# Altium footprint library SOT SOD TO DAPK.PcbLib: 156 footprints (part 8 of 10)
Each footprint in its own frame and in the unit in brackets; x right, y up, seen from the top. Pads: shape width x height; smd on the part's side, far side on the other; paste and mask are expansions set on the pad; w line width, h text height; cw(c..) or ccw(c..) is an arc to the next point about the centre after c.
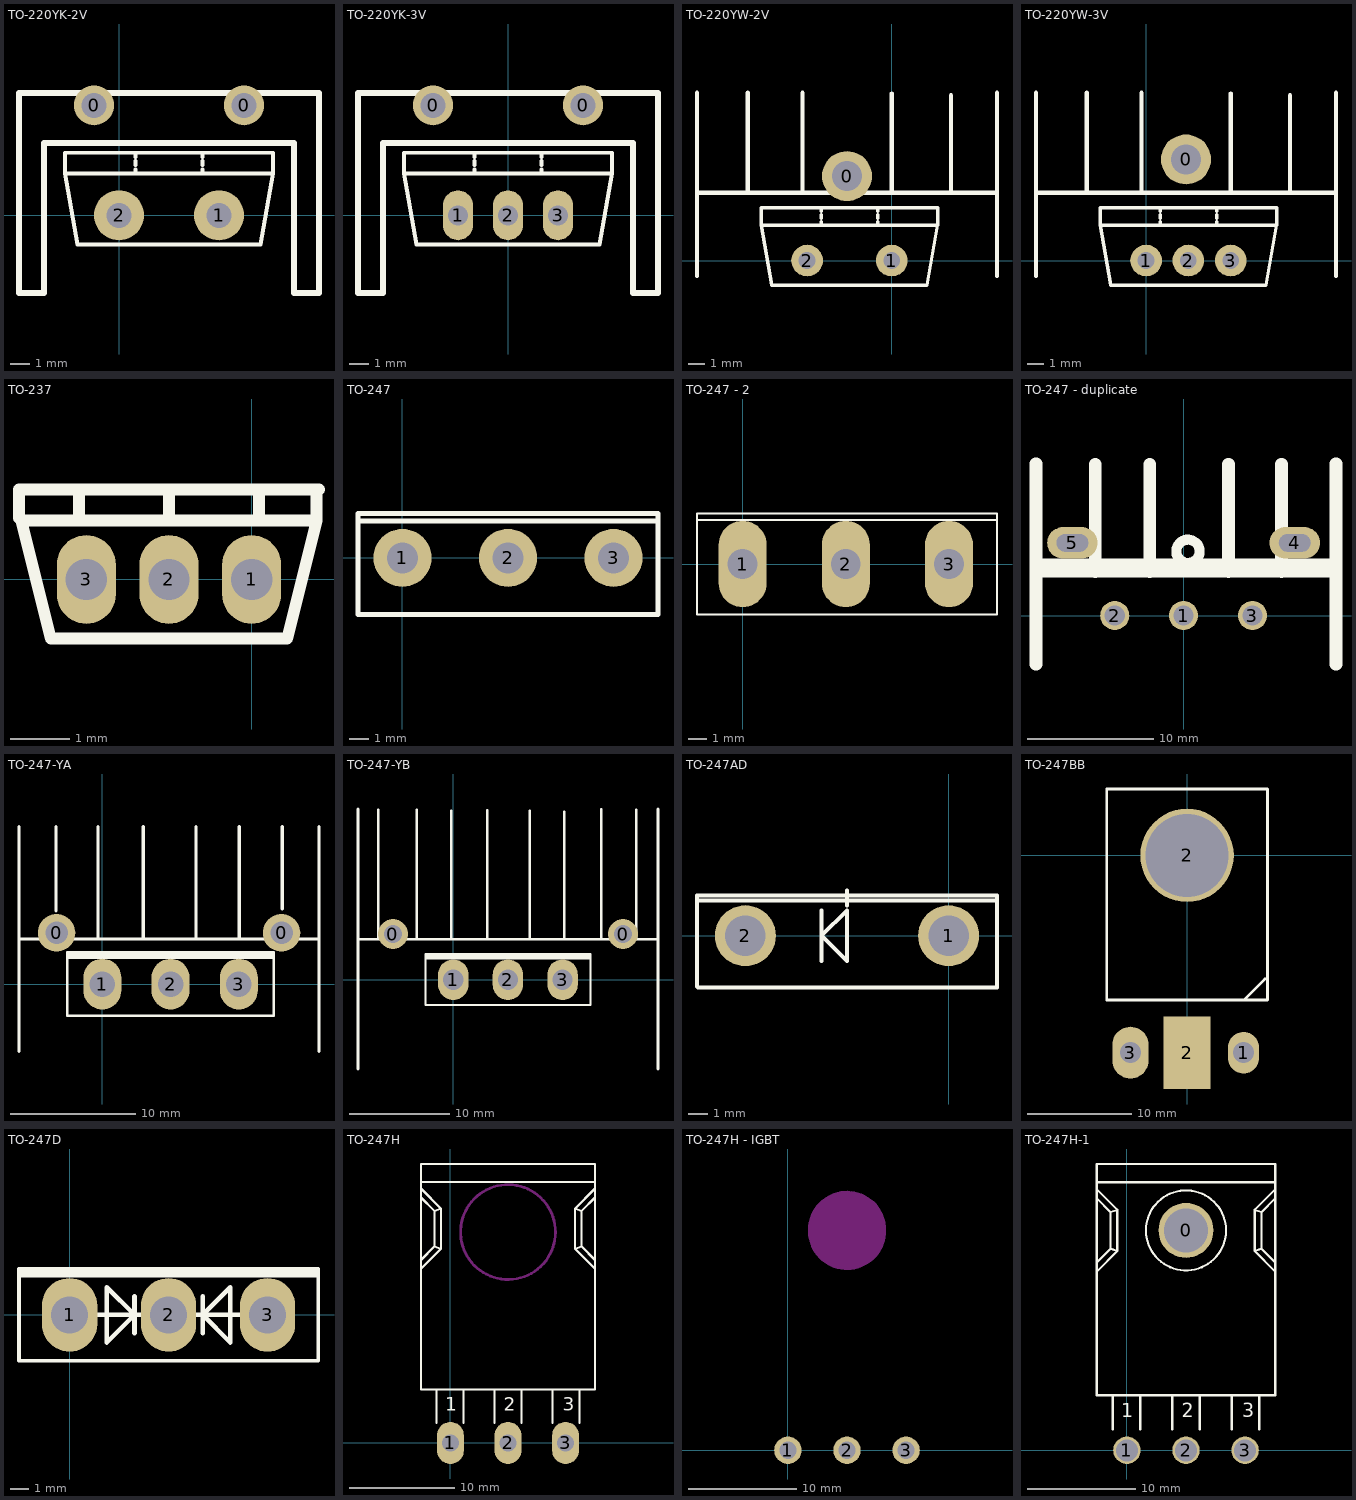
[diagram p7: the footprints below, top view; thin cyan lines are the x and y axes]

## TO-220YK-2V [mil]
pads (4):
  round 80 hole 50: 0(-50,220) 0(250,220)
  round 100 hole 50: 1(200,0) 2(0,0)
Top Overlay:
  lines w7.87: 33.33,83.33 33.33,91.67 ; 33.33,100 33.33,108.33 ; 33.33,116.67 33.33,125 ; 166.67,83.33 166.67,91.67 ; 166.67,100 166.67,108.33 ; 166.67,116.67 166.67,125 ; -108.33,83.33 308.33,83.33 ; -108.33,83.33 -83.33,-58.33 283.33,-58.33 308.33,83.33 ; -108.33,83.33 -108.33,125 308.33,125 308.33,83.33
  lines w12: -200,-155 -200,245 400,245 400,-155 350,-155 350,145 -150,145 -150,-155 -200,-155
3D body: height 1181.1, standoff 39.37, extent -205,-155 400,245
3D body "IC2.STEP": height 767.72, standoff -157.48, extent -106.69,-56.97 306.69,128.07

## TO-220YK-3V [mil]
pads (5):
  round 80 hole 50: 0(-150,220) 0(150,220)
  oval 60x100 hole 40: 1(-100,0) 2(0,0) 3(100,0)
Top Overlay:
  lines w7.87: -66.67,83.33 -66.67,91.67 ; -66.67,100 -66.67,108.33 ; -66.67,116.67 -66.67,125 ; 66.67,83.33 66.67,91.67 ; 66.67,100 66.67,108.33 ; 66.67,116.67 66.67,125 ; -208.33,83.33 208.33,83.33 ; -208.33,83.33 -183.33,-58.33 183.33,-58.33 208.33,83.33 ; -208.33,83.33 -208.33,125 208.33,125 208.33,83.33
  lines w12: -300,-155 -300,245 300,245 300,-155 250,-155 250,145 -250,145 -250,-155 -300,-155
3D body "User Library-TO220-AB Full.STEP": height 746.06, standoff -396.85, extent -194.88,-61.02 194.88,114.47
3D body: height 1181.1, standoff 39.37, extent -310,-160 295,240

## TO-220YW-2V [mm]
pads (3):
  round 3 hole 1.8: 0(-2.684,5.064)
  round 1.9 hole 1: 1(0,0) 2(-5.08,0)
Top Overlay:
  lines w0.2: -4.233,2.117 -4.233,2.328 ; -4.233,2.54 -4.233,2.752 ; -4.233,2.963 -4.233,3.175 ; -0.847,2.117 -0.847,2.328 ; -0.847,2.54 -0.847,2.752 ; -0.847,2.963 -0.847,3.175 ; -7.832,2.117 2.752,2.117 ; -7.832,2.117 -7.197,-1.482 2.117,-1.482 2.752,2.117 ; -7.832,2.117 -7.832,3.175 2.752,3.175 2.752,2.117
  lines w0.254: -11.684,-0.936 -11.684,10.064 ; -11.684,4.064 6.316,4.064 ; -8.636,4.064 -8.636,10.064 ; -5.362,4.208 -5.362,10.064 ; 0,4.064 0,10.029 ; 3.556,4.064 3.556,9.92 ; 6.316,-0.936 6.316,10.064
3D body "IC2.STEP": height 19.5, standoff -4, extent -8.044,-1.066 2.456,3.634
3D body: height 30, standoff 1, extent -12.065,-1.016 6.35,10.033

## TO-220YW-3V [mm]
pads (4):
  round 3 hole 1.8: 0(2.396,6.064)
  round 1.9 hole 1: 1(0,0) 2(2.54,0) 3(5.08,0)
Top Overlay:
  lines w0.2: 0.847,2.117 0.847,2.328 ; 0.847,2.54 0.847,2.752 ; 0.847,2.963 0.847,3.175 ; 4.233,2.117 4.233,2.328 ; 4.233,2.54 4.233,2.752 ; 4.233,2.963 4.233,3.175 ; -2.752,2.117 -2.752,3.175 7.832,3.175 7.832,2.117 ; -2.752,2.117 -2.117,-1.482 7.197,-1.482 7.832,2.117 ; -2.752,2.117 7.832,2.117
  lines w0.254: -6.604,-0.936 -6.604,10.064 ; -6.604,4.064 11.396,4.064 ; -3.556,4.064 -3.556,10.064 ; -0.282,4.208 -0.282,10.064 ; 5.08,4.064 5.08,10.029 ; 8.636,4.064 8.636,9.92 ; 11.396,-0.936 11.396,10.064
3D body "User Library-heat sink-1.STEP": height 30.62, standoff 0, extent -9.037,-3.827 13.863,12.573
3D body "User Library-TO220-AB PCB.STEP": height 20.05, standoff -3.5, extent -2.664,-1.651 7.236,2.806

## TO-237 [mm]
pads (3):
  oval 1x1.5 hole 0.7: 1(0,0) 2(-1.4,0) 3(-2.8,0)
Top Overlay:
  lines w0.2: -2.924,1 -2.924,1.524 ; -1.4,1 -1.4,1.524 ; 0.124,1 0.124,1.524 ; -3.9,1 -3.94,1.04 -3.94,1.524 1.14,1.524 1.1,1.484 1.1,1 ; -3.9,1 1.1,1 ; -3.9,1 -3.4,-1 0.6,-1 1.1,1

## TO-247 [mm]
height 0.9
pads (3):
  round 3 hole 1.6: 1(0,0) 2(5.45,0) 3(10.9,0)
Top Overlay:
  lines w0.254: -2.297,1.905 13.07,1.905 ; -2.297,-2.921 -2.297,2.286 13.197,2.286 13.197,-2.921 -2.297,-2.921
3D body "User Library-IRFP2907.step": height 25, standoff -9.85, extent -2.3,-2.5 13.2,2.5

## TO-247 - 2 [mil]
pads (3):
  oval 100x180 hole 62: 1(0,0) 2(215,0) 3(430,0)
Top Overlay:
  lines w3.94: -95,91.42 529.33,91.42 530,90.75 ; -95,-105 -95,105 530,105 530,-105 -95,-105
3D body "User Library-IRFP2907.step": height 984.25, standoff -387.64, extent -90.12,-98.43 520.12,98.43

## TO-247 - duplicate [mm]
pads (5):
  round 2.3 hole 1.6: 1(0,0) 2(-5.45,0) 3(5.45,0)
  oval 4x2.5 hole 1.4 slot 2.5 at 0 deg: 4(8.8,5.75) 5(-8.8,5.75)
Top Overlay:
  circle w0.8: c0.345,5.08 r0.925
  lines w1: -11.684,-3.849 -11.684,12.006 ; -6.985,3.486 -6.985,11.986 ; -2.667,3.486 -2.667,11.986 ; 3.556,3.486 3.556,11.986 ; 7.747,3.486 7.747,11.986 ; 12.065,-3.849 12.065,12.006
  lines w1.5: -11.43,3.75 11.43,3.75
Mechanical 15:
  lines w0.1: -0.5,0 0.5,0 ; 0,-0.5 0,0.5
3D body "User Library-TO_247.STEP": height 25, standoff -11.05, extent -7.9,-2.337 7.9,2.973

## TO-247-YA [mil]
pads (5):
  round 118.11 hole 70.87: 0(-144.29,161.42) 0(564.37,161.42)
  oval 120x160 hole 80: 1(0,0) 2(215,0) 3(430,0)
Top Overlay:
  lines w7.87: -110,83.33 540,83.33 ; -110,86.67 540,86.67 ; -110,91.67 540,91.67 ; -110,95 540,95 ; -110,-100 540,-100 540,100 -110,100 -110,-100
  lines w10: -262.4,-212.32 -262.4,496.34 ; -262.4,141.73 682.48,141.73 ; -145.39,230.94 -145.39,496.34 ; -13.5,147.4 -13.5,496.34 ; 128.94,141.73 128.94,496.34 ; 295.12,143.11 295.12,496.34 ; 431.1,147.4 431.1,496.34 ; 566.77,236.57 566.77,496.34 ; 682.48,-212.32 682.48,496.34
3D body "User Library-TO_247.STEP": height 1102.36, standoff -316.86, extent -101.02,-100 521.02,109.06

## TO-247-YB [mil]
pads (5):
  round 118.11 hole 70.87: 0(-237.64,179.29) 0(667.87,179.29)
  oval 120x160 hole 80: 1(0,0) 2(215,0) 3(430,0)
Top Overlay:
  lines w7.87: -110,83.33 540,83.33 ; -110,86.67 540,86.67 ; -110,91.67 540,91.67 ; -110,95 540,95 ; 6.79,82.94 423.45,82.94 ; 148.45,82.94 148.45,91.27 ; -110,-100 540,-100 540,100 -110,100 -110,-100
  lines w10: -375.43,-351.93 -375.43,671.69 ; -375.43,159.61 805.67,159.61 ; -295.47,167.44 -295.47,668.19 ; -144.41,159.61 -144.41,668.15 ; -8.43,165.28 -8.43,663.9 ; 134.02,159.61 134.02,665.98 ; 300.2,160.98 300.2,663.86 ; 436.18,165.28 436.18,661.65 ; 582.91,165.28 582.91,670.32 ; 720,159.61 720,669.25 ; 805.67,-351.93 805.67,671.69
3D body "User Library-TO_247.STEP": height 1062.99, standoff -356.23, extent -97.05,-70 525,139.06
3D body "User Library-Heat Sink 6400BG.STEP": height 2559.06, standoff -118.11, extent -683.54,-370 970,630

## TO-247AD [mil]
pads (2):
  round 120 hole 80: 1(0,0) 2(-400,0)
Top Overlay:
  lines w7.87: -200,59.05 -200,88.58 -200,78.74 ; 95.28,68.9 -495.28,68.9 -495.28,-100 ; -495.28,-100 -493.7,-101.58 95.28,-101.58 95.28,78.74 -495.28,78.74 -495.28,-100
  lines w8: -250,-50 -250,50 ; 95.28,-101.58 95.28,68.9 ; -250,0 -200,50 -200,-50 -250,0
3D body "User Library-IRFP2907.STEP": height 1062.99, standoff -308.9, extent -500.12,-121.85 110.12,75

## TO-247BB [mm]
pads (4):
  oval 3x4 hole 2.032: 1(5.45,-19)
  rect 4.5x7 all layers, no hole: 2(0,-19)
  round 9 hole 8: 2(0,0)
  oval 3.5x5 hole 2.032: 3(-5.45,-19)
Top Overlay:
  lines w0.254: 5.461,-13.927 7.493,-11.895 7.747,-11.895 ; -7.747,-13.927 7.747,-13.927 7.747,6.393 -7.747,6.393 -7.747,-13.927
3D body "User Library-TO-247H.STEP": height 3.9, standoff -8, extent -8.004,-19.138 7.496,6.262

## TO-247D [mil]
pads (3):
  oval 120x160 hole 80: 1(0,0) 2(215,0) 3(430,0)
Top Overlay:
  rectangle: -109.96,81.58 541.73,103.74
  lines w7.87: -110,-100 -110,100 540,100 540,-100 -110,-100
  lines w10: 60.86,0 160.86,0 ; 140.86,-40 140.86,40 ; 269.14,0 369.14,0 ; 289.14,-40 289.14,40 ; 80.86,-60 140.86,0 80.86,60 80.86,-40 80.86,-60 ; 289.14,0 349.14,60 349.14,-40 349.14,-60 289.14,0
3D body "User Library-TO_247.STEP": height 1102.36, standoff -316.86, extent -96.02,-94.06 526.02,115

## TO-247H [mm]
pads (3):
  oval 2.54x4 hole 1.6: 1(0,0) 2(5.461,0) 3(10.922,0)
Top Overlay:
  lines w0.2: -2.794,16.51 -0.889,18.415 ; -2.794,17.357 -1.524,18.627 ; -2.794,23.283 -1.524,22.013 ; -2.794,24.13 -0.889,22.225 ; -2.794,24.765 13.716,24.765 ; -1.312,1.905 -1.312,5.08 ; 1.228,1.905 1.228,5.08 ; 4.191,1.905 4.191,5.08 ; 6.731,1.905 6.731,5.08 ; 9.694,1.905 9.694,5.08 ; 12.234,1.905 12.234,5.08 ; 13.716,16.51 11.811,18.415 ; 13.716,17.357 12.446,18.627 ; 13.716,23.283 12.446,22.013 ; 13.716,24.13 11.811,22.225 ; -1.524,18.627 -0.889,18.415 ; -1.524,18.627 -1.524,22.013 ; -1.524,22.013 -0.889,22.225 ; -0.889,18.415 -0.889,22.225 ; 11.811,18.415 12.446,18.627 ; 11.811,18.415 11.811,22.225 ; 11.811,22.225 12.446,22.013 ; 12.446,18.627 12.446,22.013 ; -2.794,5.08 -2.794,26.458 13.716,26.458 13.716,5.08 -2.794,5.08
  text "3" at 10.668,3.048 h1.27
  text "2" at 5.08,3.048 h1.27
  text "1" at -0.508,3.048 h1.27
Keep-Out Layer:
  circle w0.254: c5.461,20 r4.5
3D body "User Library-TO-247H.STEP": height 2.9, standoff -9, extent -2.292,-0.254 13.208,25.146

## TO-247H - IGBT [mm]
pads (3):
  round 2.54 hole 1.575: 1(0,0) 2(5.461,0) 3(10.922,0)
Bottom Overlay:
  circle w0.2: c5.461,20.32 r1.5
  lines w0.2: -2.794,16.51 -0.889,18.415 ; -2.794,17.357 -1.524,18.627 ; -2.794,23.283 -1.524,22.013 ; -2.794,24.13 -0.889,22.225 ; -2.794,24.765 13.716,24.765 ; -1.312,1.905 -1.312,5.08 ; 1.228,1.905 1.228,5.08 ; 4.191,1.905 4.191,5.08 ; 6.731,1.905 6.731,5.08 ; 9.694,1.905 9.694,5.08 ; 12.234,1.905 12.234,5.08 ; 13.716,16.51 11.811,18.415 ; 13.716,17.357 12.446,18.627 ; 13.716,23.283 12.446,22.013 ; 13.716,24.13 11.811,22.225 ; -1.524,18.627 -1.524,22.013 ; -1.524,18.627 -0.889,18.415 ; -1.524,22.013 -0.889,22.225 ; -0.889,18.415 -0.889,22.225 ; 11.811,18.415 11.811,22.225 ; 11.811,18.415 12.446,18.627 ; 11.811,22.225 12.446,22.013 ; 12.446,18.627 12.446,22.013 ; -2.794,5.08 13.716,5.08 13.716,26.458 -2.794,26.458 -2.794,5.08
  text "3" at 11.43,3.048 h1.27
  text "2" at 5.842,3.048 h1.27
  text "1" at 0.254,3.048 h1.27
Keep-Out Layer:
  circle w0.1: c5.461,20.32 r3.6
  board cut-out: 9.061,20.326 9.061,20.561 8.999,21.028 8.878,21.482 8.697,21.917 8.462,22.324 8.176,22.697 7.843,23.03 7.47,23.317 7.062,23.552 6.628,23.732 6.173,23.854 5.707,23.915 5.472,23.915 5.451,23.915 5.216,23.915 4.749,23.854 4.294,23.732 3.86,23.552 3.452,23.316 3.079,23.03 2.746,22.697 2.46,22.324 2.224,21.916 2.044,21.481 1.922,21.027 1.861,20.56 1.861,20.325 1.861,20.089 1.923,19.621 2.045,19.165 2.225,18.729 2.461,18.321 2.748,17.946 3.082,17.613 3.457,17.325 3.865,17.089 4.301,16.909 4.757,16.787 5.225,16.725 5.461,16.725 5.481,16.725 5.716,16.725 6.181,16.786 6.634,16.908 7.068,17.087 7.474,17.322 7.846,17.608 8.178,17.939 8.464,18.312 8.698,18.718 8.878,19.152 8.999,19.605 9.061,20.07 9.061,20.305
3D body "TO-247H.STEP": height 8, standoff -3.9, extent -2.289,-0.3 13.211,25.82

## TO-247H-1 [mil]
pads (4):
  round 200 hole 160: 0(215,800)
  round 100 hole 80: 1(0,0) 2(215,0) 3(430,0)
Top Overlay:
  circle w7.87: c215,800 r145.6
  lines w7.87: -110,650 -35,725 ; -110,683.33 -60,733.33 ; -110,916.67 -60,866.67 ; -110,950 -35,875 ; -110,975 540,975 ; -51.67,75 -51.67,200 ; 48.33,75 48.33,200 ; 165,75 165,200 ; 265,75 265,200 ; 381.67,75 381.67,200 ; 481.67,75 481.67,200 ; 540,650 465,725 ; 540,683.33 490,733.33 ; 540,916.67 490,866.67 ; 540,950 465,875 ; -60,733.33 -60,866.67 ; -60,733.33 -35,725 ; -60,866.67 -35,875 ; -35,725 -35,875 ; 465,725 465,875 ; 465,725 490,733.33 ; 465,875 490,866.67 ; 490,733.33 490,866.67 ; -110,200 540,200 540,1041.67 -110,1041.67 -110,200
  text "1" at -20,120 h50
  text "2" at 200,120 h50
  text "3" at 420,120 h50
3D body "User Library-TO-247H.STEP": height 153.54, standoff -314.96, extent -90,0 520.24,1000